# Altium footprint library LUMI_Standard_Auto_Soldering_LIB.PcbLib: 344 footprints (part 11 of 22)
Each footprint in its own frame and in the unit in brackets; x right, y up, seen from the top. Pads: shape width x height; smd on the part's side, far side on the other; paste and mask are expansions set on the pad; w line width, h text height; cw(c..) or ccw(c..) is an arc to the next point about the centre after c.
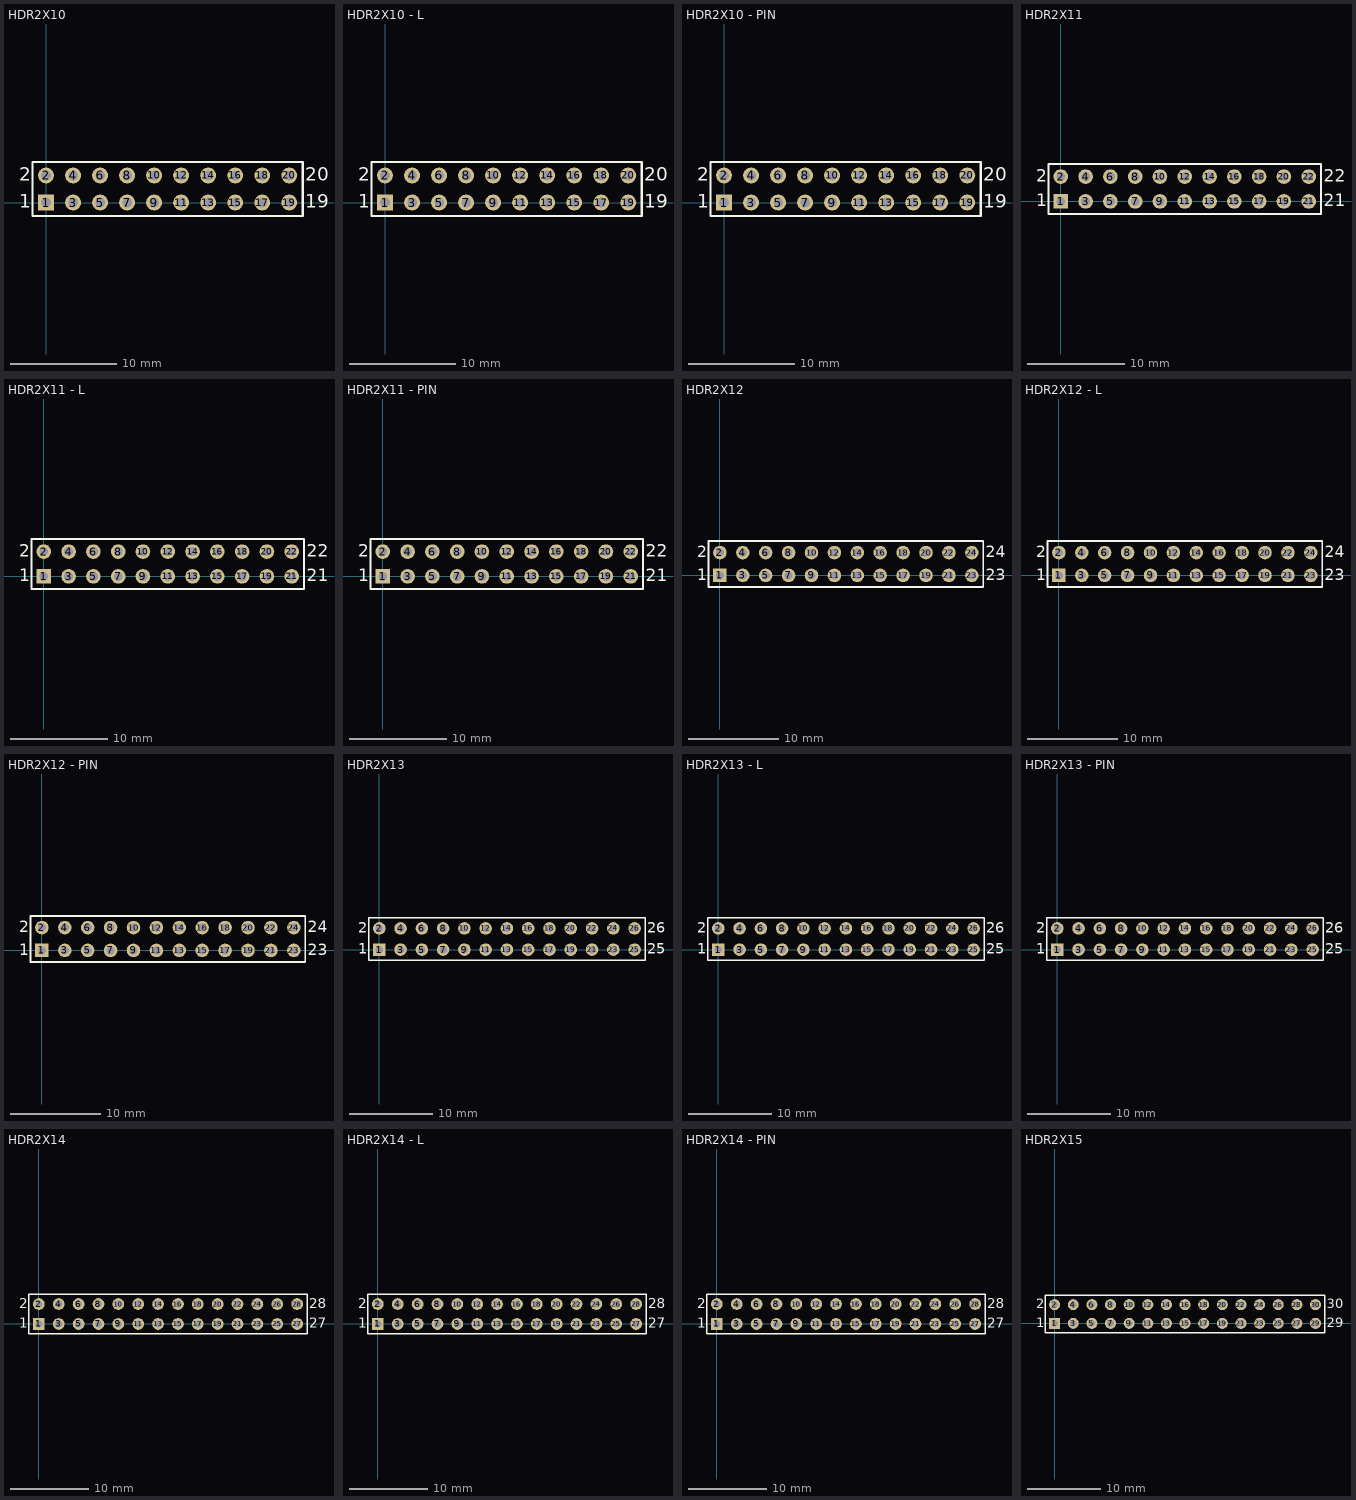
[diagram p10: the footprints below, top view; thin cyan lines are the x and y axes]

## HDR2X10 [mm] "Connector; Header; 10x2 Position"
pads (20):
  rect 1.5x1.5 hole 0.9: 1(0,0)
  round 1.5 hole 0.9: 2(0,2.54) 3(2.54,0) 4(2.54,2.54) 5(5.08,0) 6(5.08,2.54) 7(7.62,0) 8(7.62,2.54) 9(10.16,0) 10(10.16,2.54) 11(12.7,0) 12(12.7,2.54) 13(15.24,0) 14(15.24,2.54) 15(17.78,0) 16(17.78,2.54) 17(20.32,0) 18(20.32,2.54) 19(22.86,0) 20(22.86,2.54)
Top Overlay:
  lines w0.2: -1.27,-1.27 -1.27,3.81 0.635,3.81 24.13,3.81 24.13,-1.27 0.635,-1.27 -1.27,-1.27
  text "2" at -2.54,2.032 h1.27
  text "1" at -2.54,-0.508 h1.27
  text "19" at 24.384,-0.508 h1.27
  text "20" at 24.384,2.032 h1.27
3D body: height 8.4, standoff -3, extent -1.219,-1.23 24.181,3.77

## HDR2X10 - L [mm] "Connector; Header; 10x2 Position"
pads (20):
  rect 1.5x1.5 hole 0.9: 1(0,0)
  round 1.5 hole 0.9: 2(0,2.54) 3(2.54,0) 4(2.54,2.54) 5(5.08,0) 6(5.08,2.54) 7(7.62,0) 8(7.62,2.54) 9(10.16,0) 10(10.16,2.54) 11(12.7,0) 12(12.7,2.54) 13(15.24,0) 14(15.24,2.54) 15(17.78,0) 16(17.78,2.54) 17(20.32,0) 18(20.32,2.54) 19(22.86,0) 20(22.86,2.54)
Top Overlay:
  lines w0.2: -1.27,-1.27 -1.27,3.81 0.635,3.81 24.13,3.81 24.13,-1.27 0.635,-1.27 -1.27,-1.27
  text "2" at -2.54,2.032 h1.27
  text "1" at -2.54,-0.508 h1.27
  text "19" at 24.384,-0.508 h1.27
  text "20" at 24.384,2.032 h1.27
3D body: height 3.2, standoff -5.08, extent 21.539,-9.461 24.079,2.958
3D body: height 3.2, standoff -5.08, extent 19.025,-9.461 21.565,2.958
3D body: height 3.2, standoff -5.08, extent 16.485,-9.461 19.025,2.958
3D body: height 3.2, standoff -5.08, extent 13.945,-9.461 16.485,2.958
3D body: height 3.2, standoff -5.08, extent 11.405,-9.461 13.945,2.958
3D body: height 3.2, standoff -5.08, extent 8.865,-9.461 11.405,2.958
3D body: height 3.2, standoff -5.08, extent 6.325,-9.461 8.865,2.958
3D body: height 3.2, standoff -5.08, extent 3.81,-9.461 6.35,2.958
3D body: height 3.2, standoff -5.08, extent 1.27,-9.461 3.81,2.958
3D body: height 3.2, standoff -5.08, extent -1.194,-9.461 1.346,2.958

## HDR2X10 - PIN [mm] "Connector; Header; 10x2 Position"
pads (20):
  rect 1.5x1.5 hole 0.9: 1(0,0)
  round 1.5 hole 0.9: 2(0,2.54) 3(2.54,0) 4(2.54,2.54) 5(5.08,0) 6(5.08,2.54) 7(7.62,0) 8(7.62,2.54) 9(10.16,0) 10(10.16,2.54) 11(12.7,0) 12(12.7,2.54) 13(15.24,0) 14(15.24,2.54) 15(17.78,0) 16(17.78,2.54) 17(20.32,0) 18(20.32,2.54) 19(22.86,0) 20(22.86,2.54)
Top Overlay:
  lines w0.2: -1.27,-1.27 0.635,-1.27 24.13,-1.27 24.13,3.81 0.635,3.81 -1.27,3.81 -1.27,-1.27
  text "20" at 24.384,2.032 h1.27
  text "19" at 24.384,-0.508 h1.27
  text "1" at -2.54,-0.508 h1.27
  text "2" at -2.54,2.032 h1.27
3D body: height 6.02, standoff -3.1, extent -1.245,-1.245 1.295,3.835
3D body: height 6.02, standoff -3.1, extent 1.27,-1.245 3.81,3.835
3D body: height 6.02, standoff -3.1, extent 3.785,-1.245 6.325,3.835
3D body: height 6.02, standoff -3.1, extent 6.299,-1.245 8.839,3.835
3D body: height 6.02, standoff -3.1, extent 8.814,-1.245 11.354,3.835
3D body: height 6.02, standoff -3.1, extent 11.328,-1.245 13.868,3.835
3D body: height 6.02, standoff -3.1, extent 13.843,-1.245 16.383,3.835
3D body: height 6.02, standoff -3.1, extent 16.383,-1.245 18.923,3.835
3D body: height 6.02, standoff -3.1, extent 18.898,-1.245 21.438,3.835
3D body: height 6.02, standoff -3.1, extent 21.387,-1.245 23.927,3.835

## HDR2X11 [mm] "Connector; Header; 11x2 Position"
pads (22):
  rect 1.5x1.5 hole 0.9: 1(0,0)
  round 1.5 hole 0.9: 2(0,2.54) 3(2.54,0) 4(2.54,2.54) 5(5.08,0) 6(5.08,2.54) 7(7.62,0) 8(7.62,2.54) 9(10.16,0) 10(10.16,2.54) 11(12.7,0) 12(12.7,2.54) 13(15.24,0) 14(15.24,2.54) 15(17.78,0) 16(17.78,2.54) 17(20.32,0) 18(20.32,2.54) 19(22.86,0) 20(22.86,2.54) 21(25.4,0) 22(25.4,2.54)
Top Overlay:
  lines w0.2: -1.27,-1.27 -1.27,3.81 26.67,3.81 26.67,-1.27 -1.27,-1.27
  text "1" at -2.54,-0.508 h1.27
  text "2" at -2.54,2.032 h1.27
  text "21" at 26.924,-0.508 h1.27
  text "22" at 26.924,2.032 h1.27
3D body: height 8.4, standoff -3, extent 18.999,-1.179 26.619,3.821
3D body: height 8.4, standoff -3, extent 8.941,-1.179 19.101,3.821
3D body: height 8.4, standoff -3, extent -1.27,-1.179 8.89,3.821

## HDR2X11 - L [mm] "Connector; Header; 11x2 Position"
pads (22):
  rect 1.5x1.5 hole 0.9: 1(0,0)
  round 1.5 hole 0.9: 2(0,2.54) 3(2.54,0) 4(2.54,2.54) 5(5.08,0) 6(5.08,2.54) 7(7.62,0) 8(7.62,2.54) 9(10.16,0) 10(10.16,2.54) 11(12.7,0) 12(12.7,2.54) 13(15.24,0) 14(15.24,2.54) 15(17.78,0) 16(17.78,2.54) 17(20.32,0) 18(20.32,2.54) 19(22.86,0) 20(22.86,2.54) 21(25.4,0) 22(25.4,2.54)
Top Overlay:
  lines w0.2: -1.27,-1.27 26.67,-1.27 26.67,3.81 -1.27,3.81 -1.27,-1.27
  text "22" at 26.924,2.032 h1.27
  text "21" at 26.924,-0.508 h1.27
  text "2" at -2.54,2.032 h1.27
  text "1" at -2.54,-0.508 h1.27
3D body: height 3.2, standoff -5.08, extent 24.028,-9.435 26.568,2.984
3D body: height 3.2, standoff -5.08, extent 21.539,-9.435 24.079,2.984
3D body: height 3.2, standoff -5.08, extent 18.999,-9.435 21.539,2.984
3D body: height 3.2, standoff -5.08, extent 16.459,-9.435 18.999,2.984
3D body: height 3.2, standoff -5.08, extent 13.919,-9.435 16.459,2.984
3D body: height 3.2, standoff -5.08, extent 11.481,-9.435 14.021,2.984
3D body: height 3.2, standoff -5.08, extent 8.941,-9.435 11.481,2.984
3D body: height 3.2, standoff -5.08, extent 6.401,-9.435 8.941,2.984
3D body: height 3.2, standoff -5.08, extent 3.886,-9.435 6.426,2.984
3D body: height 3.2, standoff -5.08, extent 1.346,-9.435 3.886,2.984
3D body: height 3.2, standoff -5.08, extent -1.194,-9.435 1.346,2.984

## HDR2X11 - PIN [mm] "Connector; Header; 11x2 Position"
pads (22):
  rect 1.5x1.5 hole 0.9: 1(0,0)
  round 1.5 hole 0.9: 2(0,2.54) 3(2.54,0) 4(2.54,2.54) 5(5.08,0) 6(5.08,2.54) 7(7.62,0) 8(7.62,2.54) 9(10.16,0) 10(10.16,2.54) 11(12.7,0) 12(12.7,2.54) 13(15.24,0) 14(15.24,2.54) 15(17.78,0) 16(17.78,2.54) 17(20.32,0) 18(20.32,2.54) 19(22.86,0) 20(22.86,2.54) 21(25.4,0) 22(25.4,2.54)
Top Overlay:
  lines w0.2: -1.27,-1.27 -1.27,3.81 26.67,3.81 26.67,-1.27 -1.27,-1.27
  text "1" at -2.54,-0.508 h1.27
  text "2" at -2.54,2.032 h1.27
  text "21" at 26.924,-0.508 h1.27
  text "22" at 26.924,2.032 h1.27
3D body: height 6.02, standoff -3.1, extent 24.054,-1.27 26.594,3.81
3D body: height 6.02, standoff -3.1, extent 21.514,-1.27 24.054,3.81
3D body: height 6.02, standoff -3.1, extent 18.999,-1.27 21.539,3.81
3D body: height 6.02, standoff -3.1, extent 16.485,-1.27 19.025,3.81
3D body: height 6.02, standoff -3.1, extent 13.945,-1.27 16.485,3.81
3D body: height 6.02, standoff -3.1, extent 11.405,-1.27 13.945,3.81
3D body: height 6.02, standoff -3.1, extent 8.865,-1.27 11.405,3.81
3D body: height 6.02, standoff -3.1, extent 6.35,-1.27 8.89,3.81
3D body: height 6.02, standoff -3.1, extent 3.81,-1.27 6.35,3.81
3D body: height 6.02, standoff -3.1, extent 1.27,-1.27 3.81,3.81
3D body: height 6.02, standoff -3.1, extent -1.245,-1.27 1.295,3.81

## HDR2X12 [mm] "Connector; Header; 12x2 Position"
pads (24):
  rect 1.5x1.5 hole 0.9: 1(0,0)
  round 1.5 hole 0.9: 2(0,2.54) 3(2.54,0) 4(2.54,2.54) 5(5.08,0) 6(5.08,2.54) 7(7.62,0) 8(7.62,2.54) 9(10.16,0) 10(10.16,2.54) 11(12.7,0) 12(12.7,2.54) 13(15.24,0) 14(15.24,2.54) 15(17.78,0) 16(17.78,2.54) 17(20.32,0) 18(20.32,2.54) 19(22.86,0) 20(22.86,2.54) 21(25.4,0) 22(25.4,2.54) 23(27.94,0) 24(27.94,2.54)
Top Overlay:
  lines w0.2: -1.27,-1.27 29.21,-1.27 29.21,3.81 -1.27,3.81 -1.27,-1.27
  text "24" at 29.464,2.032 h1.27
  text "23" at 29.464,-0.508 h1.27
  text "2" at -2.54,2.032 h1.27
  text "1" at -2.54,-0.508 h1.27
3D body: height 8.4, standoff -3, extent -1.321,-1.204 29.159,3.796

## HDR2X12 - L [mm] "Connector; Header; 12x2 Position"
pads (24):
  rect 1.5x1.5 hole 0.9: 1(0,0)
  round 1.5 hole 0.9: 2(0,2.54) 3(2.54,0) 4(2.54,2.54) 5(5.08,0) 6(5.08,2.54) 7(7.62,0) 8(7.62,2.54) 9(10.16,0) 10(10.16,2.54) 11(12.7,0) 12(12.7,2.54) 13(15.24,0) 14(15.24,2.54) 15(17.78,0) 16(17.78,2.54) 17(20.32,0) 18(20.32,2.54) 19(22.86,0) 20(22.86,2.54) 21(25.4,0) 22(25.4,2.54) 23(27.94,0) 24(27.94,2.54)
Top Overlay:
  lines w0.2: -1.27,-1.27 -1.27,3.81 29.21,3.81 29.21,-1.27 -1.27,-1.27
  text "1" at -2.54,-0.508 h1.27
  text "2" at -2.54,2.032 h1.27
  text "23" at 29.464,-0.508 h1.27
  text "24" at 29.464,2.032 h1.27
3D body: height 3.2, standoff -5.08, extent -1.143,-9.435 1.397,2.984
3D body: height 3.2, standoff -5.08, extent 1.346,-9.435 3.886,2.984
3D body: height 3.2, standoff -5.08, extent 3.861,-9.435 6.401,2.984
3D body: height 3.2, standoff -5.08, extent 6.375,-9.435 8.915,2.984
3D body: height 3.2, standoff -5.08, extent 8.915,-9.435 11.455,2.984
3D body: height 3.2, standoff -5.08, extent 11.43,-9.435 13.97,2.984
3D body: height 3.2, standoff -5.08, extent 13.97,-9.435 16.51,2.984
3D body: height 3.2, standoff -5.08, extent 16.459,-9.435 18.999,2.984
3D body: height 3.2, standoff -5.08, extent 18.974,-9.435 21.514,2.984
3D body: height 3.2, standoff -5.08, extent 21.514,-9.435 24.054,2.984
3D body: height 3.2, standoff -5.08, extent 24.054,-9.435 26.594,2.984
3D body: height 3.2, standoff -5.08, extent 26.594,-9.435 29.134,2.984

## HDR2X12 - PIN [mm] "Connector; Header; 12x2 Position"
pads (24):
  rect 1.5x1.5 hole 0.9: 1(0,0)
  round 1.5 hole 0.9: 2(0,2.54) 3(2.54,0) 4(2.54,2.54) 5(5.08,0) 6(5.08,2.54) 7(7.62,0) 8(7.62,2.54) 9(10.16,0) 10(10.16,2.54) 11(12.7,0) 12(12.7,2.54) 13(15.24,0) 14(15.24,2.54) 15(17.78,0) 16(17.78,2.54) 17(20.32,0) 18(20.32,2.54) 19(22.86,0) 20(22.86,2.54) 21(25.4,0) 22(25.4,2.54) 23(27.94,0) 24(27.94,2.54)
Top Overlay:
  lines w0.2: -1.27,-1.27 29.21,-1.27 29.21,3.81 -1.27,3.81 -1.27,-1.27
  text "24" at 29.464,2.032 h1.27
  text "23" at 29.464,-0.508 h1.27
  text "2" at -2.54,2.032 h1.27
  text "1" at -2.54,-0.508 h1.27
3D body: height 6.02, standoff -3.1, extent -1.245,-1.27 1.295,3.81
3D body: height 6.02, standoff -3.1, extent 1.27,-1.27 3.81,3.81
3D body: height 6.02, standoff -3.1, extent 3.81,-1.27 6.35,3.81
3D body: height 6.02, standoff -3.1, extent 6.325,-1.27 8.865,3.81
3D body: height 6.02, standoff -3.1, extent 8.839,-1.27 11.379,3.81
3D body: height 6.02, standoff -3.1, extent 11.354,-1.27 13.894,3.81
3D body: height 6.02, standoff -3.1, extent 13.868,-1.27 16.408,3.81
3D body: height 6.02, standoff -3.1, extent 16.408,-1.27 18.948,3.81
3D body: height 6.02, standoff -3.1, extent 18.948,-1.27 21.488,3.81
3D body: height 6.02, standoff -3.1, extent 21.463,-1.27 24.003,3.81
3D body: height 6.02, standoff -3.1, extent 24.003,-1.27 26.543,3.81
3D body: height 6.02, standoff -3.1, extent 26.543,-1.27 29.083,3.81

## HDR2X13 [mm] "Connector; Header; 13x2 Position"
pads (26):
  rect 1.5x1.5 hole 0.9: 1(0,0)
  round 1.5 hole 0.9: 2(0,2.54) 3(2.54,0) 4(2.54,2.54) 5(5.08,0) 6(5.08,2.54) 7(7.62,0) 8(7.62,2.54) 9(10.16,0) 10(10.16,2.54) 11(12.7,0) 12(12.7,2.54) 13(15.24,0) 14(15.24,2.54) 15(17.78,0) 16(17.78,2.54) 17(20.32,0) 18(20.32,2.54) 19(22.86,0) 20(22.86,2.54) 21(25.4,0) 22(25.4,2.54) 23(27.94,0) 24(27.94,2.54) 25(30.48,0) 26(30.48,2.54)
Top Overlay:
  lines w0.2: -1.27,-1.27 31.75,-1.27 31.75,3.81 -1.27,3.81 -1.27,-1.27
  text "26" at 32.004,2.032 h1.27
  text "25" at 32.004,-0.508 h1.27
  text "1" at -2.54,-0.508 h1.27
  text "2" at -2.54,2.032 h1.27
3D body: height 8.4, standoff -3, extent 18.974,-1.23 31.674,3.77
3D body: height 8.4, standoff -3, extent 6.274,-1.23 18.974,3.77
3D body: height 8.4, standoff -3, extent -1.321,-1.23 6.299,3.77

## HDR2X13 - L [mm] "Connector; Header; 13x2 Position"
pads (26):
  rect 1.5x1.5 hole 0.9: 1(0,0)
  round 1.5 hole 0.9: 2(0,2.54) 3(2.54,0) 4(2.54,2.54) 5(5.08,0) 6(5.08,2.54) 7(7.62,0) 8(7.62,2.54) 9(10.16,0) 10(10.16,2.54) 11(12.7,0) 12(12.7,2.54) 13(15.24,0) 14(15.24,2.54) 15(17.78,0) 16(17.78,2.54) 17(20.32,0) 18(20.32,2.54) 19(22.86,0) 20(22.86,2.54) 21(25.4,0) 22(25.4,2.54) 23(27.94,0) 24(27.94,2.54) 25(30.48,0) 26(30.48,2.54)
Top Overlay:
  lines w0.2: -1.27,-1.27 31.75,-1.27 31.75,3.81 -1.27,3.81 -1.27,-1.27
  text "26" at 32.004,2.032 h1.27
  text "25" at 32.004,-0.508 h1.27
  text "1" at -2.54,-0.508 h1.27
  text "2" at -2.54,2.032 h1.27
3D body: height 3.2, standoff -5.08, extent 29.134,-9.41 31.674,3.009
3D body: height 3.2, standoff -5.08, extent 26.619,-9.41 29.159,3.009
3D body: height 3.2, standoff -5.08, extent 24.079,-9.41 26.619,3.009
3D body: height 3.2, standoff -5.08, extent 21.539,-9.41 24.079,3.009
3D body: height 3.2, standoff -5.08, extent 18.999,-9.41 21.539,3.009
3D body: height 3.2, standoff -5.08, extent 16.459,-9.41 18.999,3.009
3D body: height 3.2, standoff -5.08, extent 13.97,-9.41 16.51,3.009
3D body: height 3.2, standoff -5.08, extent 11.43,-9.41 13.97,3.009
3D body: height 3.2, standoff -5.08, extent 8.89,-9.41 11.43,3.009
3D body: height 3.2, standoff -5.08, extent 6.35,-9.41 8.89,3.009
3D body: height 3.2, standoff -5.08, extent 3.81,-9.41 6.35,3.009
3D body: height 3.2, standoff -5.08, extent 1.321,-9.41 3.861,3.009
3D body: height 3.2, standoff -5.08, extent -1.219,-9.41 1.321,3.009

## HDR2X13 - PIN [mm] "Connector; Header; 13x2 Position"
pads (26):
  rect 1.5x1.5 hole 0.9: 1(0,0)
  round 1.5 hole 0.9: 2(0,2.54) 3(2.54,0) 4(2.54,2.54) 5(5.08,0) 6(5.08,2.54) 7(7.62,0) 8(7.62,2.54) 9(10.16,0) 10(10.16,2.54) 11(12.7,0) 12(12.7,2.54) 13(15.24,0) 14(15.24,2.54) 15(17.78,0) 16(17.78,2.54) 17(20.32,0) 18(20.32,2.54) 19(22.86,0) 20(22.86,2.54) 21(25.4,0) 22(25.4,2.54) 23(27.94,0) 24(27.94,2.54) 25(30.48,0) 26(30.48,2.54)
Top Overlay:
  lines w0.2: -1.27,-1.27 -1.27,3.81 31.75,3.81 31.75,-1.27 -1.27,-1.27
  text "2" at -2.54,2.032 h1.27
  text "1" at -2.54,-0.508 h1.27
  text "25" at 32.004,-0.508 h1.27
  text "26" at 32.004,2.032 h1.27
3D body: height 6.02, standoff -3.1, extent 29.108,-1.27 31.648,3.81
3D body: height 6.02, standoff -3.1, extent 26.568,-1.27 29.108,3.81
3D body: height 6.02, standoff -3.1, extent 24.028,-1.27 26.568,3.81
3D body: height 6.02, standoff -3.1, extent 21.488,-1.27 24.028,3.81
3D body: height 6.02, standoff -3.1, extent 19.025,-1.27 21.565,3.81
3D body: height 6.02, standoff -3.1, extent 16.535,-1.27 19.075,3.81
3D body: height 6.02, standoff -3.1, extent 13.995,-1.27 16.535,3.81
3D body: height 6.02, standoff -3.1, extent 11.455,-1.27 13.995,3.81
3D body: height 6.02, standoff -3.1, extent 8.915,-1.27 11.455,3.81
3D body: height 6.02, standoff -3.1, extent 6.375,-1.27 8.915,3.81
3D body: height 6.02, standoff -3.1, extent 3.835,-1.27 6.375,3.81
3D body: height 6.02, standoff -3.1, extent 1.295,-1.27 3.835,3.81
3D body: height 6.02, standoff -3.1, extent -1.245,-1.27 1.295,3.81

## HDR2X14 [mm] "Connector; Header; 14x2 Position"
pads (28):
  rect 1.5x1.5 hole 0.9: 1(0,0)
  round 1.5 hole 0.9: 2(0,2.54) 3(2.54,0) 4(2.54,2.54) 5(5.08,0) 6(5.08,2.54) 7(7.62,0) 8(7.62,2.54) 9(10.16,0) 10(10.16,2.54) 11(12.7,0) 12(12.7,2.54) 13(15.24,0) 14(15.24,2.54) 15(17.78,0) 16(17.78,2.54) 17(20.32,0) 18(20.32,2.54) 19(22.86,0) 20(22.86,2.54) 21(25.4,0) 22(25.4,2.54) 23(27.94,0) 24(27.94,2.54) 25(30.48,0) 26(30.48,2.54) 27(33.02,0) 28(33.02,2.54)
Top Overlay:
  lines w0.2: -1.27,-1.27 34.29,-1.27 34.29,3.81 -1.27,3.81 -1.27,-1.27
  text "28" at 34.544,2.032 h1.27
  text "27" at 34.544,-0.508 h1.27
  text "1" at -2.54,-0.508 h1.27
  text "2" at -2.54,2.032 h1.27
3D body: height 8.4, standoff -3, extent -1.27,-1.23 8.89,3.77
3D body: height 8.4, standoff -3, extent 8.915,-1.23 21.615,3.77
3D body: height 8.4, standoff -3, extent 21.615,-1.23 34.315,3.77

## HDR2X14 - L [mm] "Connector; Header; 14x2 Position"
pads (28):
  rect 1.5x1.5 hole 0.9: 1(0,0)
  round 1.5 hole 0.9: 2(0,2.54) 3(2.54,0) 4(2.54,2.54) 5(5.08,0) 6(5.08,2.54) 7(7.62,0) 8(7.62,2.54) 9(10.16,0) 10(10.16,2.54) 11(12.7,0) 12(12.7,2.54) 13(15.24,0) 14(15.24,2.54) 15(17.78,0) 16(17.78,2.54) 17(20.32,0) 18(20.32,2.54) 19(22.86,0) 20(22.86,2.54) 21(25.4,0) 22(25.4,2.54) 23(27.94,0) 24(27.94,2.54) 25(30.48,0) 26(30.48,2.54) 27(33.02,0) 28(33.02,2.54)
Top Overlay:
  lines w0.2: -1.27,-1.27 -1.27,3.81 34.29,3.81 34.29,-1.27 -1.27,-1.27
  text "2" at -2.54,2.032 h1.27
  text "1" at -2.54,-0.508 h1.27
  text "27" at 34.544,-0.508 h1.27
  text "28" at 34.544,2.032 h1.27
3D body: height 3.2, standoff -5.08, extent -1.194,-9.537 1.346,2.882
3D body: height 3.2, standoff -5.08, extent 1.295,-9.537 3.835,2.882
3D body: height 3.2, standoff -5.08, extent 3.785,-9.537 6.325,2.882
3D body: height 3.2, standoff -5.08, extent 6.325,-9.537 8.865,2.882
3D body: height 3.2, standoff -5.08, extent 8.865,-9.537 11.405,2.882
3D body: height 3.2, standoff -5.08, extent 11.405,-9.537 13.945,2.882
3D body: height 3.2, standoff -5.08, extent 13.945,-9.537 16.485,2.882
3D body: height 3.2, standoff -5.08, extent 16.485,-9.537 19.025,2.882
3D body: height 3.2, standoff -5.08, extent 19.025,-9.537 21.565,2.882
3D body: height 3.2, standoff -5.08, extent 21.565,-9.537 24.105,2.882
3D body: height 3.2, standoff -5.08, extent 24.105,-9.537 26.645,2.882
3D body: height 3.2, standoff -5.08, extent 26.619,-9.537 29.159,2.882
3D body: height 3.2, standoff -5.08, extent 29.159,-9.537 31.699,2.882
3D body: height 3.2, standoff -5.08, extent 31.674,-9.537 34.214,2.882

## HDR2X14 - PIN [mm] "Connector; Header; 14x2 Position"
pads (28):
  rect 1.5x1.5 hole 0.9: 1(0,0)
  round 1.5 hole 0.9: 2(0,2.54) 3(2.54,0) 4(2.54,2.54) 5(5.08,0) 6(5.08,2.54) 7(7.62,0) 8(7.62,2.54) 9(10.16,0) 10(10.16,2.54) 11(12.7,0) 12(12.7,2.54) 13(15.24,0) 14(15.24,2.54) 15(17.78,0) 16(17.78,2.54) 17(20.32,0) 18(20.32,2.54) 19(22.86,0) 20(22.86,2.54) 21(25.4,0) 22(25.4,2.54) 23(27.94,0) 24(27.94,2.54) 25(30.48,0) 26(30.48,2.54) 27(33.02,0) 28(33.02,2.54)
Top Overlay:
  lines w0.2: -1.27,-1.27 34.29,-1.27 34.29,3.81 -1.27,3.81 -1.27,-1.27
  text "28" at 34.544,2.032 h1.27
  text "27" at 34.544,-0.508 h1.27
  text "1" at -2.54,-0.508 h1.27
  text "2" at -2.54,2.032 h1.27
3D body: height 6.02, standoff -3.1, extent 31.648,-1.27 34.188,3.81
3D body: height 6.02, standoff -3.1, extent 29.134,-1.27 31.674,3.81
3D body: height 6.02, standoff -3.1, extent 26.619,-1.27 29.159,3.81
3D body: height 6.02, standoff -3.1, extent 24.105,-1.27 26.645,3.81
3D body: height 6.02, standoff -3.1, extent 21.615,-1.27 24.155,3.81
3D body: height 6.02, standoff -3.1, extent 19.075,-1.27 21.615,3.81
3D body: height 6.02, standoff -3.1, extent 16.535,-1.27 19.075,3.81
3D body: height 6.02, standoff -3.1, extent 13.995,-1.27 16.535,3.81
3D body: height 6.02, standoff -3.1, extent 11.455,-1.27 13.995,3.81
3D body: height 6.02, standoff -3.1, extent 8.915,-1.27 11.455,3.81
3D body: height 6.02, standoff -3.1, extent 6.401,-1.27 8.941,3.81
3D body: height 6.02, standoff -3.1, extent 3.861,-1.27 6.401,3.81
3D body: height 6.02, standoff -3.1, extent 1.346,-1.27 3.886,3.81
3D body: height 6.02, standoff -3.1, extent -1.168,-1.27 1.372,3.81

## HDR2X15 [mm] "Connector; Header; 15x2 Position"
pads (30):
  rect 1.5x1.5 hole 0.9: 1(0,0)
  round 1.5 hole 0.9: 2(0,2.54) 3(2.54,0) 4(2.54,2.54) 5(5.08,0) 6(5.08,2.54) 7(7.62,0) 8(7.62,2.54) 9(10.16,0) 10(10.16,2.54) 11(12.7,0) 12(12.7,2.54) 13(15.24,0) 14(15.24,2.54) 15(17.78,0) 16(17.78,2.54) 17(20.32,0) 18(20.32,2.54) 19(22.86,0) 20(22.86,2.54) 21(25.4,0) 22(25.4,2.54) 23(27.94,0) 24(27.94,2.54) 25(30.48,0) 26(30.48,2.54) 27(33.02,0) 28(33.02,2.54) 29(35.56,0) 30(35.56,2.54)
Top Overlay:
  lines w0.2: -1.27,-1.27 -1.27,3.81 36.83,3.81 36.83,-1.27 -1.27,-1.27
  text "30" at 37.084,2.032 h1.27
  text "29" at 37.084,-0.508 h1.27
  text "2" at -2.54,2.032 h1.27
  text "1" at -2.54,-0.508 h1.27
3D body: height 8.4, standoff -3, extent 24.054,-1.23 36.754,3.77
3D body: height 8.4, standoff -3, extent 11.328,-1.23 24.028,3.77
3D body: height 8.4, standoff -3, extent -1.244,-1.23 11.456,3.77